# Altium footprint library STM32F103_Warship.PcbLib: 55 footprints (part 4 of 4)
Each footprint in its own frame and in the unit in brackets; x right, y up, seen from the top. Pads: shape width x height; smd on the part's side, far side on the other; paste and mask are expansions set on the pad; w line width, h text height; cw(c..) or ccw(c..) is an arc to the next point about the centre after c.
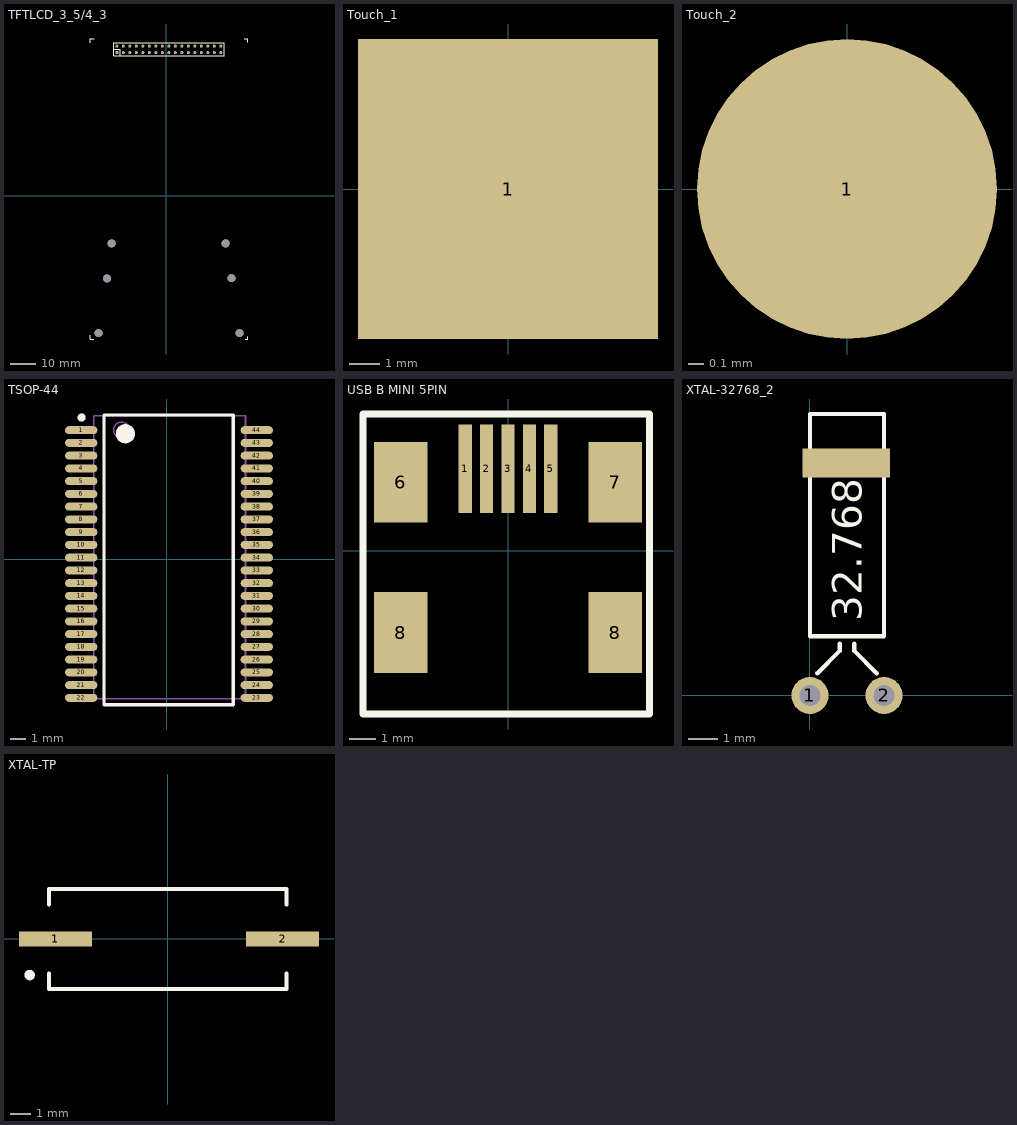
[diagram p3: the footprints below, top view; thin cyan lines are the x and y axes]

## TFTLCD_3_5/4_3 [mm]
pads (40):
  rect 1.2x1.2 hole 0.7: 1(-19.23,55.886)
  round 1.2 hole 0.7: 2(-19.23,58.426) 3(-16.69,55.886) 4(-16.69,58.426) 5(-14.148,55.88) 6(-14.15,58.426) 7(-11.608,55.88) 8(-11.608,58.42) 9(-9.07,55.886) 10(-9.07,58.426) 11(-6.53,55.886) 12(-6.53,58.426) 13(-3.99,55.886) 14(-3.99,58.426) 15(-1.45,55.886) 16(-1.45,58.426) 17(1.09,55.886) 18(1.09,58.426) 19(3.63,55.886) 20(3.63,58.426) 21(6.17,55.886) 22(6.17,58.426) 23(8.71,55.886) 24(8.71,58.426) 25(11.25,55.886) 26(11.25,58.426) 27(13.79,55.886) 28(13.79,58.426) 29(16.33,55.886) 30(16.33,58.426) 31(18.87,55.886) 32(18.87,58.426) 33(21.41,55.886) 34(21.41,58.426)
  round 3.1 hole 3.1: ""(-26.353,-53.716) ""(-23.038,-32.3) ""(-21.265,-18.645) ""(23.312,-18.645) ""(25.592,-32.24) ""(28.697,-53.716)
Top Overlay:
  lines w0.203: -20.498,57.15 -17.958,57.15 -17.958,54.65 -17.908,54.6 -20.488,54.6 -20.498,54.61 -20.498,59.7 22.682,59.7 22.682,54.62 ; -18.018,54.6 22.682,54.6 ; 22.682,54.63 22.682,54.93
  lines w0.254: -29.631,-54.458 -29.631,-56.007 -28.219,-56.007 ; -29.631,59.792 -29.631,61.214 ; -29.608,61.214 -27.965,61.214 ; 30.531,61.214 31.942,61.214 ; 30.937,-56.007 31.964,-56.007 31.964,-55.093 ; 31.964,59.893 31.964,61.214
3D body "User Library-BL1-010-S842-55.step": height 8.42, standoff -3.2, extent -20.824,54.61 5.076,57.15
3D body "User Library-BL1-010-S842-55.step": height 8.42, standoff -3.2, extent -3.069,54.61 22.831,57.15
3D body "User Library-BL1-010-S842-55.step": height 8.42, standoff -3.2, extent -3.069,57.15 22.831,59.69
3D body "User Library-BL1-010-S842-55.step": height 8.42, standoff -3.2, extent -20.824,57.15 5.076,59.69

## Touch_1 [mm] "10mm*10mm"
pads (1):
  rect 10x10 smd: 1(0,0)

## Touch_2 [mm] "R = 2mm"
pads (1):
  round 2 smd: 1(0,0)

## TSOP-44 [mil]
pads (44):
  oval 80x20 smd: 1(-211.01,318.72) 2(-211.01,287.22) 3(-211.01,255.72) 4(-211.01,224.23) 5(-211.01,192.73) 6(-211.01,161.24) 7(-211.01,129.74) 8(-211.01,98.24) 9(-211.01,66.75) 10(-211.01,35.25) 11(-211.01,3.76) 12(-211.01,-27.74) 13(-211.01,-59.24) 14(-211.01,-90.73) 15(-211.01,-122.23) 16(-211.01,-153.72) 17(-211.01,-185.22) 18(-211.01,-216.72) 19(-211.01,-248.23) 20(-211.01,-279.72) 21(-211.01,-311.22) 22(-211.01,-342.72) 23(222.99,-342.72) 24(222.99,-311.22) 25(222.99,-279.72) 26(222.99,-248.23) 27(223.01,-216.72) 28(223.01,-185.22) 29(223.01,-153.72) 30(223.01,-122.23) 31(223.01,-90.73) 32(223.01,-59.24) 33(223.01,-27.74) 34(223.01,3.76) 35(223.01,35.25) 36(223.01,66.75) 37(223.01,98.24) 38(223.01,129.74) 39(223.01,161.24) 40(223.01,192.73) 41(223.01,224.23) 42(223.01,255.72) 43(223.01,287.22) 44(223.01,318.72)
Top Overlay:
  circle w9.84: c-209.92,350 r4.92
  circle w23.62: c-101.81,310 r11.81
  lines w7.87: -155,-360 -155,356.12 165,356.12 165,-360 -155,-360
Mechanical 13:
  circle w3.94: c-111.2,319.11 r19.68
  lines w3.94: -180,-345 -180,354.54 195,354.54 195,-345 -180,-345
3D body "SW3dPS-44L-TSOP2.STEP": height 39.37, standoff -3.94, extent -221.5,-374.6 241.5,350.6

## USB B MINI 5PIN [mm]
pads (9):
  rect 0.5x3.3 smd: 1(-1.6,3.054) 2(-0.8,3.054) 3(0,3.054) 4(0.8,3.054) 5(1.6,3.054)
  rect 2x3 smd: 6(-4,2.546) 7(4,2.546) 8(-4,-3.054) 8(4,-3.054)
Top Overlay:
  lines w0.254: -5.398,-6.09 5.27,-6.09 5.27,5.086 -5.398,5.086 -5.398,-6.09
3D body "usb_a-usb_b-m5-smd-c.stp": height 3.93, standoff -1, extent -5.116,-6.115 4.784,3.135

## XTAL-32768_2 [mil]
pads (3):
  round 50 hole 28: 1(0,0) 2(100,0)
  rect 118.11x39.37 smd: ""(49,314)
Top Overlay:
  lines w5.91: 10,30 40,60 40,70 ; 60,70 60,60 90,30 ; 0,80 0,380 100,380 100,80 0,80
  text "32.768K" at 70,100 h40
3D body "User Library-TC38 SMD.step": height 78.74, standoff -9.84, extent -4.92,-1.18 104.92,372.84

## XTAL-TP [mm]
pads (2):
  rect 3.5x0.7 smd: 1(-5.385,0) 2(5.512,0)
Top Overlay:
  circle w0.25: c-6.625,-1.73 r0.125
  lines w0.2: -5.7,-1.65 -5.7,-2.4 5.7,-2.4 5.7,-1.65 ; -5.7,1.65 -5.7,2.4 5.7,2.4 5.7,1.65
3D body "User Library-hc49_cystal.STEP": height 4, standoff 0, extent -6.7,-2.462 6.7,2.438